# Altium footprint library Pcb-hionyPcbLib.PcbLib: 580 footprints (part 21 of 37)
Each footprint in its own frame and in the unit in brackets; x right, y up, seen from the top. Pads: shape width x height; smd on the part's side, far side on the other; paste and mask are expansions set on the pad; w line width, h text height; cw(c..) or ccw(c..) is an arc to the next point about the centre after c.
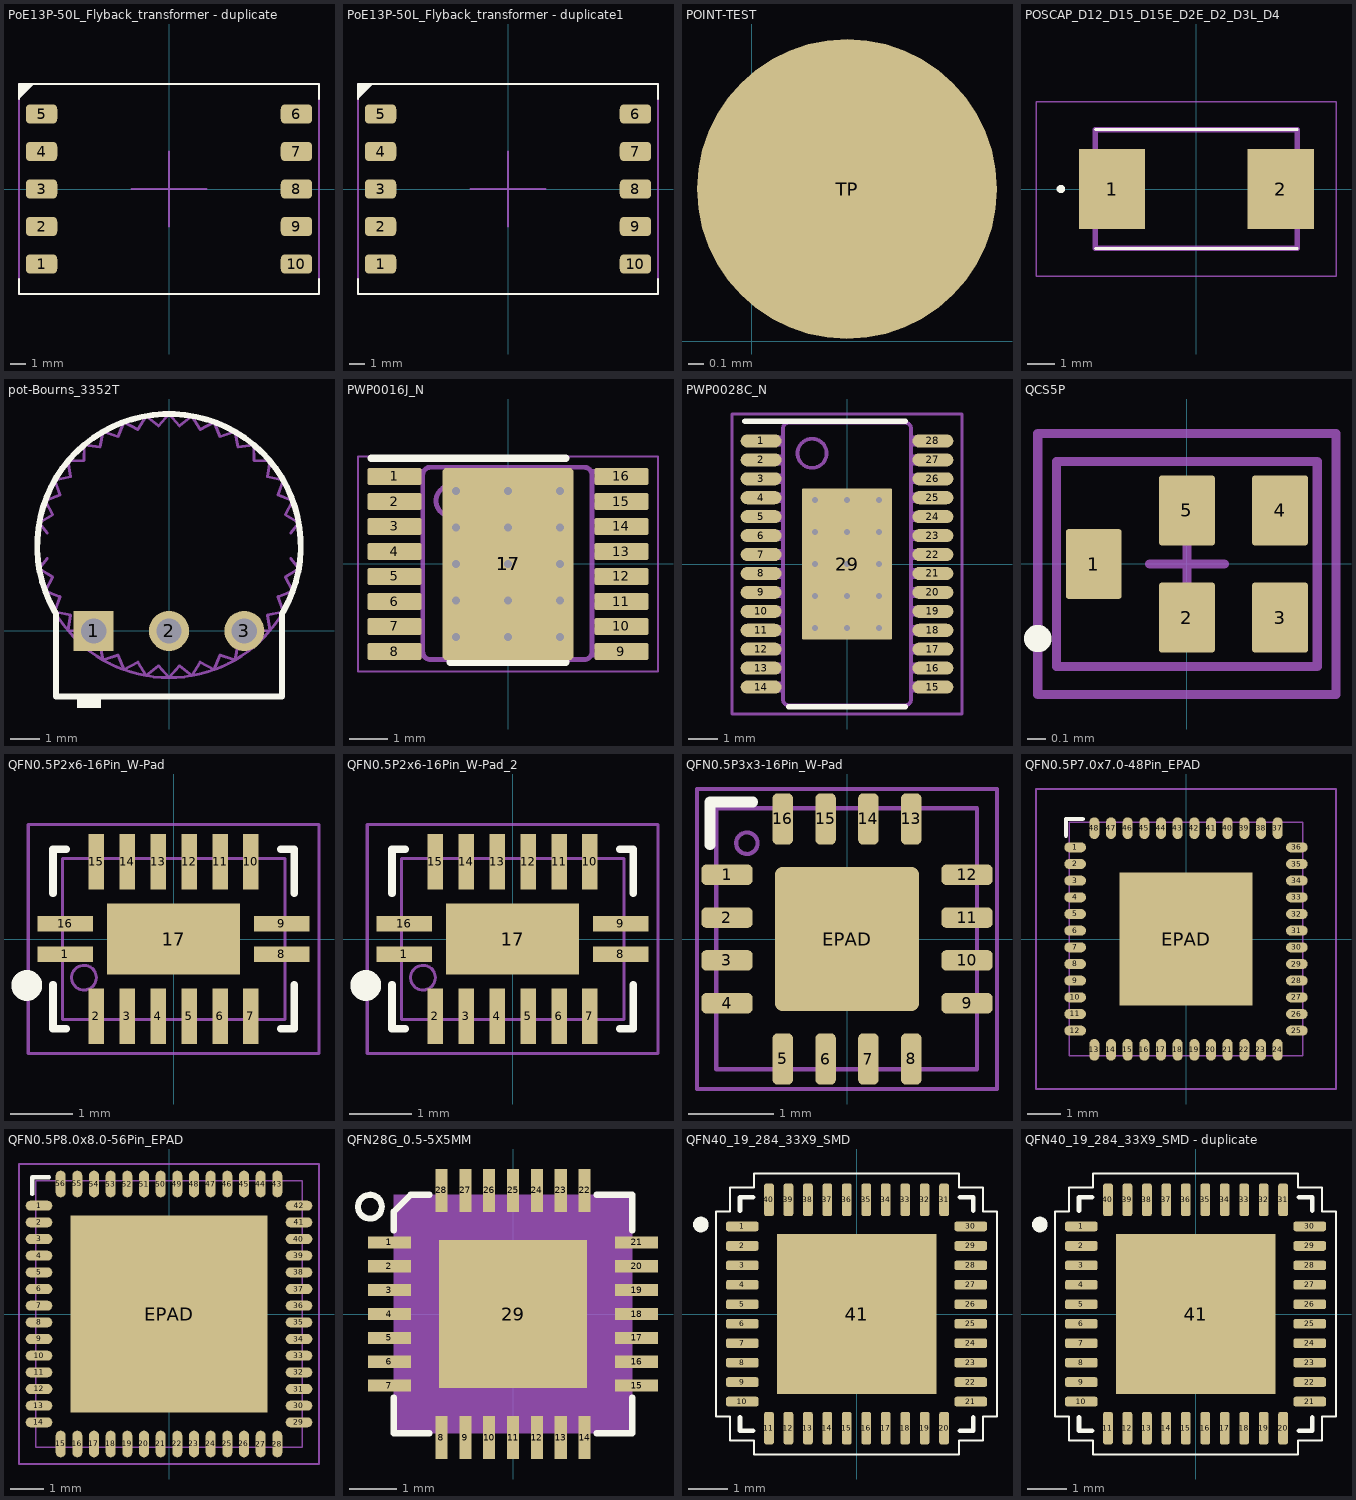
[diagram p20: the footprints below, top view; thin cyan lines are the x and y axes]

## PoE13P-50L_Flyback_transformer - duplicate [mm]
pads (10):
  rrect50% 2.1x1.3 smd mask+0.05: 1(-8.5,-5) 2(-8.5,-2.5) 3(-8.5,0) 4(-8.5,2.5) 5(-8.5,5) 6(8.5,5) 7(8.5,2.5) 8(8.5,0) 9(8.5,-2.5) 10(8.5,-5)
Top Overlay:
  region: -10,6 -9,7 -10,7
  lines w0.15: -10,-6 -10,-7 10,-7 10,-6 ; -10,6 -10,7 10,7 10,6
Mechanical 15:
  lines w0.15: -2.5,0 2.5,0 ; 0,-2.5 0,2.5 ; -10,-7 -10,7 10,7 10,-7 -10,-7
  text "6" at 8.5,4.5 h0.55
  text "1" at -9,-5.5 h0.55
  text ".Designator" at -0.525,-3.6 h0.55
  text "10" at 8.5,-5.5 h0.55
  text "5" at -9,4.5 h0.55
3D body "Coilcraft-POE13P-50L.step": height 12.7, standoff 0, extent -8.875,-6.73 8.875,6.73

## PoE13P-50L_Flyback_transformer - duplicate1 [mm]
pads (10):
  rrect50% 2.1x1.3 smd mask+0.05: 1(-8.5,-5) 2(-8.5,-2.5) 3(-8.5,0) 4(-8.5,2.5) 5(-8.5,5) 6(8.5,5) 7(8.5,2.5) 8(8.5,0) 9(8.5,-2.5) 10(8.5,-5)
Top Overlay:
  region: -10,6 -9,7 -10,7
  lines w0.15: -10,-6 -10,-7 10,-7 10,-6 ; -10,6 -10,7 10,7 10,6
Mechanical 15:
  lines w0.15: -2.5,0 2.5,0 ; 0,-2.5 0,2.5 ; -10,-7 -10,7 10,7 10,-7 -10,-7
  text "6" at 8.5,4.5 h0.55
  text "1" at -9,-5.5 h0.55
  text ".Designator" at -0.525,-3.6 h0.55
  text "10" at 8.5,-5.5 h0.55
  text "5" at -9,4.5 h0.55
3D body "Coilcraft-POE13P-50L.step": height 12.7, standoff 0, extent -8.875,-6.73 8.875,6.73

## POINT-TEST [mm]
pads (1):
  round 2 smd: TP(0.635,1.016)

## POSCAP_D12_D15_D15E_D2E_D2_D3L_D4 [mm]
pads (2):
  rect 2.4x2.9 smd: 1(-3.05,0) 2(3.05,0)
Top Overlay:
  circle w0.2: c-4.9,0 r0.05
  lines w0.1: -3.65,-2.15 3.65,-2.15 ; -3.65,2.15 3.65,2.15
Mechanical 13:
  lines w0.2: -3.65,-2.15 -3.65,2.15 3.65,2.15 3.65,-2.15 -3.65,-2.15
Mechanical 15:
  lines w0.05: -5.8,-3.15 -5.8,3.15 5.05,3.15 5.05,-3.15 -5.8,-3.15
3D body "10TPE220MIL.stp": height 1.8, standoff 0, extent -3.65,-2.15 3.65,2.15

## pot-Bourns_3352T [mm]
pads (3):
  rect 1.35x1.35 hole 0.85: 1(-2.54,0)
  round 1.35 hole 0.85: 2(0,0) 3(2.54,0)
Top Overlay:
  region: -2.3,-2.6 -2.3,-2.2 -3.1,-2.2 -3.1,-2.6
  lines w0.2: -3.849,0.647 cw(c0,2.87) 3.849,0.647 ; -3.81,0.58 -3.81,-2.21 3.81,-2.21 3.81,0.58
Top 3D Body:
  lines w0.1: -4.105,2.44 -4.377,2.098 ; -4.105,3.3 -4.377,3.642 ; -3.81,0.58 -3.81,-2.21 3.81,-2.21 3.81,0.58 ; 4.105,2.44 4.377,2.098 ; 4.105,3.3 4.377,3.642 ; -4.377,2.098 ccw(c0,2.87) -4.177,1.35 ; -4.377,2.098 cw(c0,2.87) -4.377,3.642 ; -4.377,2.098 -3.922,1.819 -4.177,1.35 ; -4.377,3.642 cw(c0,2.87) -4.177,4.39 ; -4.377,3.642 -3.922,3.921 -4.177,4.39 ; -4.177,1.35 ccw(c0,2.87) -3.849,0.647 ; -4.177,1.35 -3.68,1.154 -3.849,0.647 ; -4.177,4.39 cw(c0,2.87) -3.849,5.093 ; -4.177,4.39 -3.68,4.586 -3.849,5.092 ; -3.849,0.647 ccw(c0,2.87) -3.405,0.013 ; -3.849,0.647 -3.326,0.541 -3.405,0.013 ; -3.849,5.093 cw(c0,2.87) -3.405,5.727 ; -3.849,5.092 -3.326,5.199 -3.405,5.727 ; -3.405,0.013 ccw(c0,2.87) -2.857,-0.535 ; -3.405,0.013 -2.871,-0.001 -2.857,-0.535 ; -3.405,5.727 cw(c0,2.87) -2.857,6.275 ; -3.405,5.727 -2.871,5.741 -2.857,6.275 ; -2.857,-0.535 ccw(c0,2.87) -2.223,-0.979 ; -2.857,-0.535 -2.329,-0.456 -2.222,-0.979 ; -2.857,6.275 cw(c0,2.87) -2.223,6.719 ; -2.857,6.275 -2.329,6.196 -2.222,6.719 ; -2.223,-0.979 ccw(c0,2.87) -1.52,-1.307 ; -2.222,-0.979 -1.716,-0.81 -1.52,-1.307 ; -2.223,6.719 cw(c0,2.87) -1.52,7.047 ; -2.222,6.719 -1.716,6.55 -1.52,7.047 ; -1.52,-1.307 ccw(c0,2.87) -0.772,-1.507 ; -1.52,-1.307 -1.051,-1.052 -0.772,-1.507 ; -1.52,7.047 cw(c0,2.87) -0.772,7.247 ; -1.52,7.047 -1.051,6.792 -0.772,7.247 ; -0.772,-1.507 ccw(c0,2.87) 0,-1.575 ; -0.772,-1.507 -0.354,-1.175 0,-1.575 ; -0.772,7.247 cw(c0,2.87) 0,7.315 ; -0.772,7.247 -0.354,6.915 0,7.315 ; 0,-1.575 ccw(c0,2.87) 0.772,-1.507 ; 0,-1.575 0.354,-1.175 0.772,-1.507 ; 0,7.315 cw(c0,2.87) 0.772,7.247 ; 0,7.315 0.354,6.915 0.772,7.247 ; 0.772,-1.507 ccw(c0,2.87) 1.52,-1.307 ; 0.772,-1.507 1.051,-1.052 1.52,-1.307 ; 0.772,7.247 cw(c0,2.87) 1.52,7.047 ; 0.772,7.247 1.051,6.792 1.52,7.047 ; 1.52,-1.307 ccw(c0,2.87) 2.223,-0.979 ; 1.52,-1.307 1.716,-0.81 2.222,-0.979 ; 1.52,7.047 cw(c0,2.87) 2.223,6.719 ; 1.52,7.047 1.716,6.55 2.222,6.719 ; 2.223,-0.979 ccw(c0,2.87) 2.857,-0.535 ; 2.222,-0.979 2.329,-0.456 2.857,-0.535 ; 2.223,6.719 cw(c0,2.87) 2.857,6.275 ; 2.222,6.719 2.329,6.196 2.857,6.275 ; 2.857,-0.535 ccw(c0,2.87) 3.405,0.013 ; 2.857,-0.535 2.871,-0.001 3.405,0.013 ; 2.857,6.275 cw(c0,2.87) 3.405,5.727 ; 2.857,6.275 2.871,5.741 3.405,5.727 ; 3.405,0.013 ccw(c0,2.87) 3.849,0.647 ; 3.405,0.013 3.326,0.541 3.849,0.647 ; 3.405,5.727 cw(c0,2.87) 3.849,5.093 ; 3.405,5.727 3.326,5.199 3.849,5.092 ; 3.849,0.647 ccw(c0,2.87) 4.177,1.35 ; 3.849,0.647 3.68,1.154 4.177,1.35 ; 3.849,5.093 cw(c0,2.87) 4.177,4.39 ; 3.849,5.092 3.68,4.586 4.177,4.39 ; 4.177,1.35 ccw(c0,2.87) 4.377,2.098 ; 4.177,1.35 3.922,1.819 4.377,2.098 ; 4.177,4.39 cw(c0,2.87) 4.377,3.642 ; 4.177,4.39 3.922,3.921 4.377,3.642 ; 4.377,2.098 ccw(c0,2.87) 4.377,3.642
  text ".Designator" at -2,2 h1.02
3D body "3352T.stp": height 3.81, standoff -4.75, extent -4.445,-2.21 4.445,7.315

## PWP0016J_N [mm]
pads (19):
  rrect22% 1.4x0.45 smd: 1(-2.95,2.275) 2(-2.95,1.625) 3(-2.95,0.975) 4(-2.95,0.325) 5(-2.95,-0.325) 6(-2.95,-0.975) 7(-2.95,-1.625) 8(-2.95,-2.275) 9(2.95,-2.275) 10(2.95,-1.625) 11(2.95,-0.975) 12(2.95,-0.325) 13(2.95,0.325) 14(2.95,0.975) 15(2.95,1.625) 16(2.95,2.275)
  rrect6% 3.4x5 smd paste-1.7 mask-1.7: 17(0,0)
  rrect50% 2.46x3.55 on Top Paste: 17(0,0)
  rrect50% 2.46x3.55 on Top Solder: 17(0,0)
via 0,0 diameter 0.5 hole 0.2
via 0,-0.95 diameter 0.5 hole 0.2
via 0,0.95 diameter 0.5 hole 0.2
via 0,1.9 diameter 0.5 hole 0.2
via 0,-1.9 diameter 0.5 hole 0.2
via 1.35,-1.9 diameter 0.5 hole 0.2
via 1.35,1.9 diameter 0.5 hole 0.2
via 1.35,0.95 diameter 0.5 hole 0.2
via 1.35,-0.95 diameter 0.5 hole 0.2
via 1.35,0 diameter 0.5 hole 0.2
via -1.35,-0.95 diameter 0.5 hole 0.2
via -1.35,1.9 diameter 0.5 hole 0.2
via -1.35,-1.9 diameter 0.5 hole 0.2
via -1.35,0 diameter 0.5 hole 0.2
via -1.35,0.95 diameter 0.5 hole 0.2
Top Overlay:
  lines w0.2: -3.55,2.75 1.5,2.75 ; -1.5,-2.55 1.5,-2.55
Top 3D Body:
  drawing of 202 lines, arcs and shapes, not listed
  text ".Designator" at -0.5,1.85 h1.02
Mechanical 15:
  lines w0.05: -3.9,-2.8 3.9,-2.8 3.9,2.8 -3.9,2.8 -3.9,-2.8
  lines w0.1: -0.5,0 0.5,0 ; 0,-0.5 0,0.5
3D body "PWP0016J.stp": height 1.13, standoff 0, extent -3.2,-2.5 3.2,2.5

## PWP0028C_N [mm]
pads (29):
  rrect100% 1.4x0.45 smd: 1(-2.95,4.225) 2(-2.95,3.575) 3(-2.95,2.925) 4(-2.95,2.275) 5(-2.95,1.625) 6(-2.95,0.975) 7(-2.95,0.325) 8(-2.95,-0.325) 9(-2.95,-0.975) 10(-2.95,-1.625) 11(-2.95,-2.275) 12(-2.95,-2.925) 13(-2.95,-3.575) 14(-2.95,-4.225) 15(2.95,-4.225) 16(2.95,-3.575) 17(2.95,-2.925) 18(2.95,-2.275) 19(2.95,-1.625) 20(2.95,-0.975) 21(2.95,-0.325) 22(2.95,0.325) 23(2.95,0.975) 24(2.95,1.625) 25(2.95,2.275) 26(2.95,2.925) 27(2.95,3.575) 28(2.95,4.225)
  rrect3% 3.1x5.18 smd: 29(0,0)
via 1.1,-1.1 diameter 0.5 hole 0.2
via 0,-1.1 diameter 0.5 hole 0.2
via -1.1,-1.1 diameter 0.5 hole 0.2
via -1.1,-2.2 diameter 0.5 hole 0.2
via 0,-2.2 diameter 0.5 hole 0.2
via 1.1,-2.2 diameter 0.5 hole 0.2
via 1.1,2.2 diameter 0.5 hole 0.2
via 0,2.2 diameter 0.5 hole 0.2
via -1.1,2.2 diameter 0.5 hole 0.2
via -1.1,0 diameter 0.5 hole 0.2
via -1.1,1.1 diameter 0.5 hole 0.2
via 0,1.1 diameter 0.5 hole 0.2
via 1.1,1.1 diameter 0.5 hole 0.2
via 1.1,0 diameter 0.5 hole 0.2
via 0,0 diameter 0.5 hole 0.2
Top Overlay:
  lines w0.2: -3.5,4.9 2,4.9 ; -2,-4.9 2,-4.9
Top 3D Body:
  drawing of 346 lines, arcs and shapes, not listed
  text ".Designator" at -1.854,-0.508 h1.02
Mechanical 15:
  lines w0.1: -3.95,-5.15 3.95,-5.15 3.95,5.15 -3.95,5.15 -3.95,-5.15 ; -0.5,0 0.5,0 -0.5,0 ; 0,-0.5 0,0.5 0,-0.5
3D body "PW0028AakaMTC28.stp": height 0.98, standoff -0.02, extent -3.21,-4.85 3.21,4.85

## QCS5P [mm]
pads (5):
  rrect10% 0.3x0.375 smd mask+0.05: 1(-0.5,0) 2(0,-0.288) 3(0.5,-0.288) 4(0.5,0.288) 5(0,0.287)
Top Overlay:
  circle w0.127: c-0.8,-0.4 r0.01
Mechanical 11:
  text ".Designator" at 0.325,-0.7 h0.5
Mechanical 13:
  lines w0.05: -0.7,-0.55 0.7,-0.55 0.7,0.55 -0.7,0.55 -0.7,-0.55
Mechanical 15:
  lines w0.05: -0.2,0 0.2,0 ; 0,-0.2 0,0.2 ; -0.8,-0.7 0.8,-0.7 0.8,0.7 -0.8,0.7 -0.8,-0.7
3D body "User Library-kyocera-sf14.step": height 0.7, standoff 0, extent -0.7,-0.55 0.7,0.55

## QFN0.5P2x6-16Pin_W-Pad [mm]
pads (17):
  rect 0.9x0.25 smd paste-0.025 mask+0.05: 1(-1.75,-0.25) 8(1.75,-0.25) 9(1.75,0.25) 16(-1.75,0.25)
  rect 0.25x0.9 smd paste-0.025 mask+0.05: 2(-1.25,-1.25) 3(-0.75,-1.25) 4(-0.25,-1.25) 5(0.25,-1.25) 6(0.75,-1.25) 7(1.25,-1.25) 10(1.25,1.25) 11(0.75,1.25) 12(0.25,1.25) 13(-0.25,1.25) 14(-0.75,1.25) 15(-1.25,1.25)
  rect 2.15x1.15 smd paste-3 mask+0.05: 17(0,0)
Top Overlay:
  circle w0.25: c-2.375,-0.75 r0.125
  lines w0.127: -1.95,-0.738 -1.95,-1.45 -1.739,-1.45 ; -1.95,0.738 -1.95,1.45 -1.739,1.45 ; 1.739,-1.45 1.95,-1.45 1.95,-0.738 ; 1.739,1.45 1.95,1.45 1.95,0.738
Top Paste:
  rectangle: -0.55,-0.2 -0.15,0.2
  rectangle: 0.15,-0.2 0.55,0.2
Mechanical 11:
  text ".Designator" at 0.347,0.175 h0.5
Mechanical 13:
  circle w0.05: c-1.45,-0.625 r0.2
  lines w0.05: -1.8,-1.3 1.8,-1.3 1.8,1.3 -1.8,1.3 -1.8,-1.3
Mechanical 15:
  lines w0.05: -2.35,-1.85 2.35,-1.85 2.35,1.85 -2.35,1.85 -2.35,-1.85
  lines w0.1: -0.5,0 0.5,0 ; 0,-0.5 0,0.5
3D body: height 1, standoff 0, extent -1.8,-1.3 1.8,1.3

## QFN0.5P2x6-16Pin_W-Pad_2 [mm]
pads (17):
  rect 0.9x0.25 smd paste-0.025 mask+0.05: 1(-1.75,-0.25) 8(1.75,-0.25) 9(1.75,0.25) 16(-1.75,0.25)
  rect 0.25x0.9 smd paste-0.025 mask+0.05: 2(-1.25,-1.25) 3(-0.75,-1.25) 4(-0.25,-1.25) 5(0.25,-1.25) 6(0.75,-1.25) 7(1.25,-1.25) 10(1.25,1.25) 11(0.75,1.25) 12(0.25,1.25) 13(-0.25,1.25) 14(-0.75,1.25) 15(-1.25,1.25)
  rect 2.15x1.15 smd paste-3 mask+0.05: 17(0,0)
Top Overlay:
  circle w0.25: c-2.375,-0.75 r0.125
  lines w0.127: -1.95,-0.739 -1.95,-1.45 -1.739,-1.45 ; -1.95,0.738 -1.95,1.45 -1.739,1.45 ; 1.739,-1.45 1.95,-1.45 1.95,-0.739 ; 1.739,1.45 1.95,1.45 1.95,0.739
Top Paste:
  rectangle: -0.55,-0.2 -0.15,0.2
  rectangle: 0.15,-0.2 0.55,0.2
Mechanical 11:
  text ".Designator" at 0.586,0.317 h0.5
Mechanical 13:
  circle w0.05: c-1.45,-0.625 r0.2
  lines w0.05: -1.8,-1.3 1.8,-1.3 1.8,1.3 -1.8,1.3 -1.8,-1.3
Mechanical 15:
  lines w0.05: -2.35,-1.85 2.35,-1.85 2.35,1.85 -2.35,1.85 -2.35,-1.85
  lines w0.1: -0.5,0 0.5,0 ; 0,-0.5 0,0.5
3D body: height 1, standoff 0, extent -1.8,-1.3 1.8,1.3

## QFN0.5P3x3-16Pin_W-Pad [mm]
pads (17):
  rrect50% 0.6x0.24 smd: 1(-1.4,0.75) 2(-1.4,0.25) 3(-1.4,-0.25) 4(-1.4,-0.75) 9(1.4,-0.75) 10(1.4,-0.25) 11(1.4,0.25) 12(1.4,0.75)
  rrect50% 0.24x0.6 smd: 5(-0.75,-1.4) 6(-0.25,-1.4) 7(0.25,-1.4) 8(0.75,-1.4) 13(0.75,1.4) 14(0.25,1.4) 15(-0.25,1.4) 16(-0.75,1.4)
  rrect10% 1.68x1.68 smd: EPAD(0,0)
Top Overlay:
  lines w0.127: -1.6,1.1 -1.6,1.6 -1.1,1.6
Mechanical 11:
  text ".Designator" at 0.393,0.248 h0.5
Mechanical 13:
  circle w0.05: c-1.168,1.118 r0.125
  lines w0.05: -1.524,-1.521 -1.524,1.524 1.518,1.524 1.518,-1.521 -1.524,-1.521
Mechanical 15:
  lines w0.05: -0.35,0 0.35,0 ; 0,-0.35 0,0.35 ; -1.75,-1.75 1.75,-1.75 1.75,1.75 -1.75,1.75 -1.75,-1.75
3D body "ALSRobot-QFN16 3x3.STEP": height 0.9, standoff 0, extent -1.524,-1.521 1.518,1.521

## QFN0.5P7.0x7.0-48Pin_EPAD [mm]
pads (49):
  oval 0.65x0.3 smd paste-0.05 mask+0.05: 1(-3.325,2.75) 2(-3.325,2.25) 3(-3.325,1.75) 4(-3.325,1.25) 5(-3.325,0.75) 6(-3.325,0.25) 7(-3.325,-0.25) 8(-3.325,-0.75) 9(-3.325,-1.25) 10(-3.325,-1.75) 11(-3.325,-2.25) 12(-3.325,-2.75) 25(3.325,-2.75) 26(3.325,-2.25) 27(3.325,-1.75) 28(3.325,-1.25) 29(3.325,-0.75) 30(3.325,-0.25) 31(3.325,0.25) 32(3.325,0.75) 33(3.325,1.25) 34(3.325,1.75) 35(3.325,2.25) 36(3.325,2.75)
  oval 0.3x0.65 smd paste-0.05 mask+0.05: 13(-2.75,-3.325) 14(-2.25,-3.325) 15(-1.75,-3.325) 16(-1.25,-3.325) 17(-0.75,-3.325) 18(-0.25,-3.325) 19(0.25,-3.325) 20(0.75,-3.325) 21(1.25,-3.325) 22(1.75,-3.325) 23(2.25,-3.325) 24(2.75,-3.325) 37(2.75,3.325) 38(2.25,3.325) 39(1.75,3.325) 40(1.25,3.325) 41(0.75,3.325) 42(0.25,3.325) 43(-0.25,3.325) 44(-0.75,3.325) 45(-1.25,3.325) 46(-1.75,3.325) 47(-2.25,3.325) 48(-2.75,3.325)
  rect 4x4 smd paste-10 mask+0.05: EPAD(0,0)
Top Overlay:
  lines w0.127: -3.6,3.1 -3.6,3.6 -3.1,3.6
Top Paste:
  region: 0.5,-0.5 -0.5,-0.5 -0.5,0.5 0.5,0.5
  region: 0.5,-1 0.5,-2 -0.5,-2 -0.5,-1
  region: 1,-1 2,-1 2,-2 1,-2
  region: 1,-0.5 1,0.5 2,0.5 2,-0.5
  region: -1,-0.5 -2,-0.5 -2,0.5 -1,0.5
  region: -1,-2 -2,-2 -2,-1 -1,-1
  region: 1,2 2,2 2,1 1,1
  region: -0.5,2 0.5,2 0.5,1 -0.5,1
  region: -2,2 -1,2 -1,1 -2,1
Mechanical 11:
  text ".Designator" at -0.35,-0.325 h0.25
Mechanical 13:
  circle w0.05: c-3.325,2.75 r0.034
  lines w0.05: -3.5,-3.5 3.5,-3.5 3.5,3.5 -3.5,3.5 -3.5,-3.5
Mechanical 15:
  lines w0.05: -4.5,-4.5 4.5,-4.5 4.5,4.5 -4.5,4.5 -4.5,-4.5
  lines w0.1: -0.5,0 0.5,0 ; 0,-0.5 0,0.5
3D body "ALSRobot-QFN48 7x7.step": height 0.81, standoff 0.01, extent -3.51,-3.51 3.51,3.51

## QFN0.5P8.0x8.0-56Pin_EPAD [mm]
pads (57):
  oval 0.8x0.3 smd paste-0.05 mask+0.05: 1(-3.9,3.25) 2(-3.9,2.75) 3(-3.9,2.25) 4(-3.9,1.75) 5(-3.9,1.25) 6(-3.9,0.75) 7(-3.9,0.25) 8(-3.9,-0.25) 9(-3.9,-0.75) 10(-3.9,-1.25) 11(-3.9,-1.75) 12(-3.9,-2.25) 13(-3.9,-2.75) 14(-3.9,-3.25) 29(3.9,-3.25) 30(3.9,-2.75) 31(3.9,-2.25) 32(3.9,-1.75) 33(3.9,-1.25) 34(3.9,-0.75) 35(3.9,-0.25) 36(3.9,0.25) 37(3.9,0.75) 38(3.9,1.25) 39(3.9,1.75) 40(3.9,2.25) 41(3.9,2.75) 42(3.9,3.25)
  oval 0.3x0.8 smd paste-0.05 mask+0.05: 15(-3.25,-3.9) 16(-2.75,-3.9) 17(-2.25,-3.9) 18(-1.75,-3.9) 19(-1.25,-3.9) 20(-0.75,-3.9) 21(-0.25,-3.9) 22(0.25,-3.9) 23(0.75,-3.9) 24(1.25,-3.9) 25(1.75,-3.9) 26(2.25,-3.9) 27(2.75,-3.9) 28(3.25,-3.9) 43(3.25,3.9) 44(2.75,3.9) 45(2.25,3.9) 46(1.75,3.9) 47(1.25,3.9) 48(0.75,3.9) 49(0.25,3.9) 50(-0.25,3.9) 51(-0.75,3.9) 52(-1.25,3.9) 53(-1.75,3.9) 54(-2.25,3.9) 55(-2.75,3.9) 56(-3.25,3.9)
  rect 5.9x5.9 smd paste-10 mask+0.05: EPAD(0,0)
Top Overlay:
  lines w0.127: -4.1,3.6 -4.1,4.1 -3.6,4.1
Top Paste:
  region: -0.25,0.25 -1.25,0.25 -1.25,1.25 -0.25,1.25
  region: -0.25,-0.25 -0.25,-1.25 -1.25,-1.25 -1.25,-0.25
  region: 0.25,-0.25 1.25,-0.25 1.25,-1.25 0.25,-1.25
  region: 0.25,0.25 0.25,1.25 1.25,1.25 1.25,0.25
  region: -1.75,0.25 -2.75,0.25 -2.75,1.25 -1.75,1.25
  region: -1.75,-1.25 -2.75,-1.25 -2.75,-0.25 -1.75,-0.25
  region: 1.75,-0.25 2.75,-0.25 2.75,-1.25 1.75,-1.25
  region: -1.75,-2.75 -2.75,-2.75 -2.75,-1.75 -1.75,-1.75
  region: -0.25,-2.75 -1.25,-2.75 -1.25,-1.75 -0.25,-1.75
  region: 1.25,-2.75 0.25,-2.75 0.25,-1.75 1.25,-1.75
  region: 2.75,-2.75 1.75,-2.75 1.75,-1.75 2.75,-1.75
  region: 2.75,1.25 2.75,0.25 1.75,0.25 1.75,1.25
  region: 1.75,2.75 2.75,2.75 2.75,1.75 1.75,1.75
  region: 0.25,2.75 1.25,2.75 1.25,1.75 0.25,1.75
  region: -1.25,2.75 -0.25,2.75 -0.25,1.75 -1.25,1.75
  region: -2.75,2.75 -1.75,2.75 -1.75,1.75 -2.75,1.75
Mechanical 11:
  text ".Designator" at -0.35,-0.325 h0.25
Mechanical 13:
  circle w0.05: c-3.75,3.25 r0.034
  lines w0.05: -4,-4 4,-4 4,4 -4,4 -4,-4
Mechanical 15:
  lines w0.05: -4.5,-4.5 4.5,-4.5 4.5,4.5 -4.5,4.5 -4.5,-4.5
  lines w0.1: -0.5,0 0.5,0 ; 0,-0.5 0,0.5
3D body "User Library-VQFN_56.step": height 1.06, standoff -0.04, extent -4,-4 4,4

## QFN28G_0.5-5X5MM [mm]
pads (29):
  rect 0.9x0.254 smd: 1(-2.59,1.5) 2(-2.59,1) 3(-2.59,0.5) 4(-2.59,0) 5(-2.59,-0.5) 6(-2.59,-1) 7(-2.59,-1.5) 15(2.59,-1.5) 16(2.59,-1) 17(2.59,-0.5) 18(2.59,0) 19(2.59,0.5) 20(2.59,1) 21(2.59,1.5)
  rect 0.254x0.9 smd: 8(-1.5,-2.59) 9(-1,-2.59) 10(-0.5,-2.59) 11(0,-2.59) 12(0.5,-2.59) 13(1,-2.59) 14(1.5,-2.59) 22(1.5,2.59) 23(1,2.59) 24(0.5,2.59) 25(0,2.59) 26(-0.5,2.59) 27(-1,2.59) 28(-1.5,2.59)
  rect 3.1x3.1 smd paste-3: 29(0,0)
Top Overlay:
  circle w0.127: c-3,2.25 r0.25
  lines w0.127: -2.5,-1.75 -2.5,-2.5 -1.75,-2.5 ; -2.5,1.75 -2.5,2.146 -2.146,2.5 -1.75,2.5 ; 1.75,-2.5 2.5,-2.5 2.5,-1.75 ; 1.75,2.5 2.5,2.5 2.5,1.75
Top Paste:
  region: 1.5,-1.5 0.25,-1.5 0.25,-0.25 1.5,-0.25
  region: -0.25,-1.502 -1.502,-1.502 -1.502,-0.25 -0.25,-0.25
  region: 1.5,0.25 0.25,0.25 0.25,1.5 1.5,1.5
  region: -0.25,0.25 -1.501,0.25 -1.501,1.5 -0.25,1.5
Mechanical 15:
  region: 2.5,-2.504 -2.504,-2.504 -2.504,2.5 2.5,2.5
3D body "step_temp.STEP": height 1, standoff 0, extent -2.5,-2.5 2.5,2.5

## QFN40_19_284_33X9_SMD [mm]
pads (41):
  rrect48% 0.84x0.25 smd: 1(-2.935,2.25) 2(-2.935,1.75) 3(-2.935,1.25) 4(-2.935,0.75) 5(-2.935,0.25) 6(-2.935,-0.25) 7(-2.935,-0.75) 8(-2.935,-1.25) 9(-2.935,-1.75) 10(-2.935,-2.25) 21(2.935,-2.25) 22(2.935,-1.75) 23(2.935,-1.25) 24(2.935,-0.75) 25(2.935,-0.25) 26(2.935,0.25) 27(2.935,0.75) 28(2.935,1.25) 29(2.935,1.75) 30(2.935,2.25)
  rrect48% 0.25x0.84 smd: 11(-2.25,-2.935) 12(-1.75,-2.935) 13(-1.25,-2.935) 14(-0.75,-2.935) 15(-0.25,-2.935) 16(0.25,-2.935) 17(0.75,-2.935) 18(1.25,-2.935) 19(1.75,-2.935) 20(2.25,-2.935) 31(2.25,2.935) 32(1.75,2.935) 33(1.25,2.935) 34(0.75,2.935) 35(0.25,2.935) 36(-0.25,2.935) 37(-0.75,2.935) 38(-1.25,2.935) 39(-1.75,2.935) 40(-2.25,2.935)
  rect 4.1x4.1 smd paste-3: 41(0,0)
Top Overlay:
  circle w0.2: c-4,2.3 r0.1
  lines w0.05: -3.61,-2.63 -3.25,-2.63 -3.25,-3.25 -2.63,-3.25 -2.63,-3.61 2.63,-3.61 2.63,-3.25 3.25,-3.25 3.25,-2.63 3.61,-2.63 3.61,2.63 3.25,2.63 3.25,3.25 2.63,3.25 2.63,3.61 -2.63,3.61 -2.63,3.25 -3.25,3.25 -3.25,2.63 -3.61,2.63 -3.61,-2.63
  lines w0.127: -3,-2.66 -3,-3 -2.66,-3 ; -3,2.66 -3,3 -2.66,3 ; 2.66,-3 3,-3 3,-2.66 ; 2.66,3 3,3 3,2.66
Top Paste:
  region: 1.3,-1.303 -1.303,-1.303 -1.303,1.3 1.3,1.3
3D body "ALSRobot-QFN40 6X6.STEP": height 1.06, standoff 0.01, extent -3.075,-3 3.075,3.15

## QFN40_19_284_33X9_SMD - duplicate [mm]
pads (41):
  rrect48% 0.84x0.25 smd: 1(-2.935,2.25) 2(-2.935,1.75) 3(-2.935,1.25) 4(-2.935,0.75) 5(-2.935,0.25) 6(-2.935,-0.25) 7(-2.935,-0.75) 8(-2.935,-1.25) 9(-2.935,-1.75) 10(-2.935,-2.25) 21(2.935,-2.25) 22(2.935,-1.75) 23(2.935,-1.25) 24(2.935,-0.75) 25(2.935,-0.25) 26(2.935,0.25) 27(2.935,0.75) 28(2.935,1.25) 29(2.935,1.75) 30(2.935,2.25)
  rrect48% 0.25x0.84 smd: 11(-2.25,-2.935) 12(-1.75,-2.935) 13(-1.25,-2.935) 14(-0.75,-2.935) 15(-0.25,-2.935) 16(0.25,-2.935) 17(0.75,-2.935) 18(1.25,-2.935) 19(1.75,-2.935) 20(2.25,-2.935) 31(2.25,2.935) 32(1.75,2.935) 33(1.25,2.935) 34(0.75,2.935) 35(0.25,2.935) 36(-0.25,2.935) 37(-0.75,2.935) 38(-1.25,2.935) 39(-1.75,2.935) 40(-2.25,2.935)
  rect 4.1x4.1 smd paste-3: 41(0,0)
Top Overlay:
  circle w0.2: c-4,2.3 r0.1
  lines w0.05: -3.61,-2.63 -3.25,-2.63 -3.25,-3.25 -2.63,-3.25 -2.63,-3.61 2.63,-3.61 2.63,-3.25 3.25,-3.25 3.25,-2.63 3.61,-2.63 3.61,2.63 3.25,2.63 3.25,3.25 2.63,3.25 2.63,3.61 -2.63,3.61 -2.63,3.25 -3.25,3.25 -3.25,2.63 -3.61,2.63 -3.61,-2.63
  lines w0.127: -3,-2.66 -3,-3 -2.66,-3 ; -3,2.66 -3,3 -2.66,3 ; 2.66,-3 3,-3 3,-2.66 ; 2.66,3 3,3 3,2.66
Top Paste:
  region: 1.3,-1.303 -1.303,-1.303 -1.303,1.3 1.3,1.3
3D body "ALSRobot-QFN40 6X6.STEP": height 1.06, standoff 0.01, extent -3.075,-3 3.075,3.15